# Altium footprint library EwgConnectors.PcbLib: 125 footprints (part 4 of 8)
Each footprint in its own frame and in the unit in brackets; x right, y up, seen from the top. Pads: shape width x height; smd on the part's side, far side on the other; paste and mask are expansions set on the pad; w line width, h text height; cw(c..) or ccw(c..) is an arc to the next point about the centre after c.
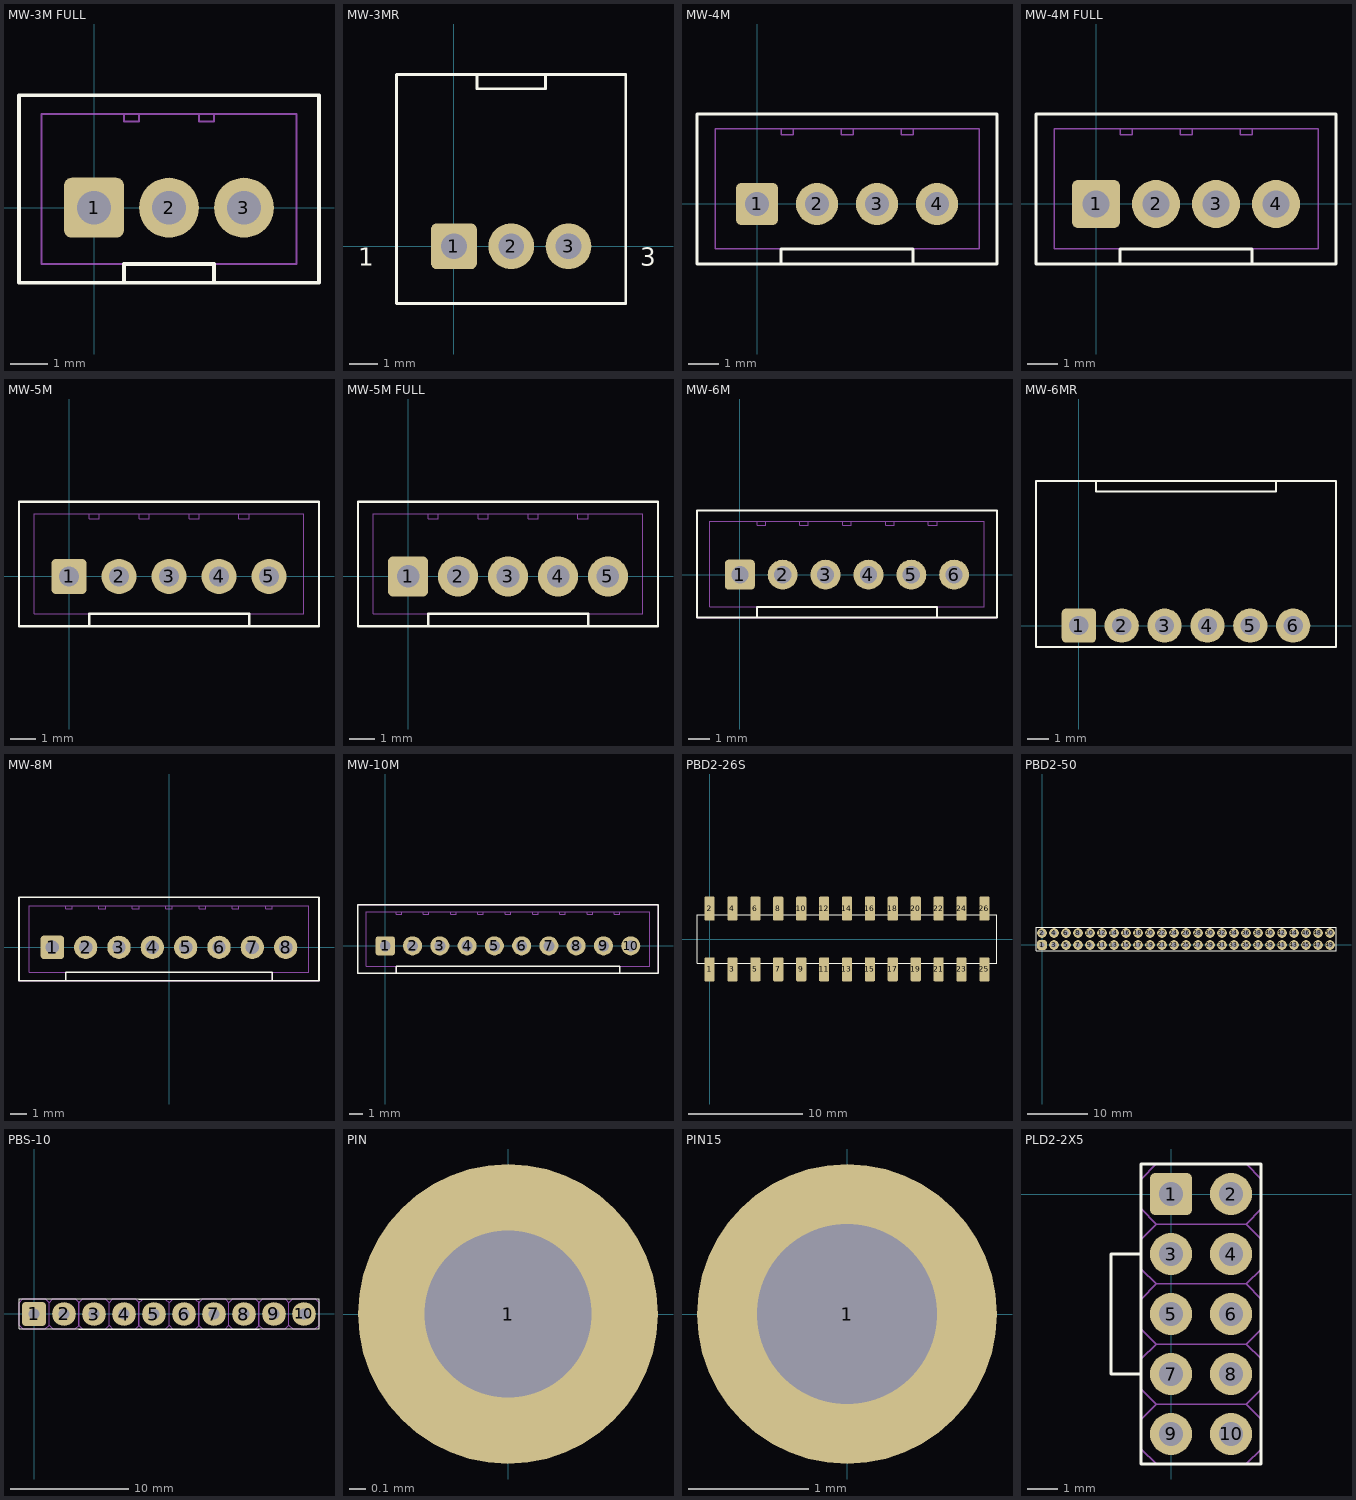
[diagram p3: the footprints below, top view; thin cyan lines are the x and y axes]

## MW-3M FULL [mm]
pads (3):
  rrect25% 1.6x1.6 hole 0.9: 1(0,0)
  round 1.6 hole 0.9: 2(2,0) 3(4,0)
Top Overlay:
  lines w0.1: 0.8,-2 0.8,-1.5 3.2,-1.5 3.2,-2 ; -2,-2 6,-2 6,2 6,3 -2,3 -2,-2
Mechanical 1:
  lines w0.05: 0.8,-2 0.8,-1.5 -1.4,-1.5 -1.4,2.5 5.4,2.5 5.4,-1.5 3.2,-1.5 3.2,-2 ; 0.8,2.5 0.8,2.3 1.2,2.3 1.2,2.5 ; 2.8,2.5 2.8,2.3 3.2,2.3 3.2,2.5 ; -2,-2 -2,3 6,3 6,-2 1.2,-2 -2,-2 ; -0.3,-0.3 0.3,-0.3 0.3,0.3 -0.3,0.3 -0.3,-0.3 ; 1.7,-0.3 1.7,0.3 2.3,0.3 2.3,-0.3 1.7,-0.3 ; 3.7,-0.3 3.7,0.3 4.3,0.3 4.3,-0.3 3.7,-0.3
3D body: height 8.9, standoff 1.5, extent -1.9,-1.75 5.9,2.75
3D body: height 6, standoff -3, extent -2,-2 6,3

## MW-3MR [mm]
pads (3):
  rrect25% 1.6x1.6 hole 0.9: 1(0,0)
  round 1.6 hole 0.9: 2(2,0) 3(4,0)
Top Overlay:
  lines w0.1: 0.8,6 0.8,5.5 3.2,5.5 3.2,6 ; -2,-2 -2,6 6,6 6,2 6,-2 -2,-2
  text "1" at -3.35,-0.675 h0.63
  text "3" at 6.5,-0.675 h0.63
Mechanical 1:
  lines w0.05: -1.4,6 5.4,6 ; 0.8,5.5 0.8,6 ; 3.2,5.5 3.2,6 ; -2,-2 1.2,-2 6,-2 6,6 -2,6 -2,-2 ; -0.3,-0.3 -0.3,0.3 0.3,0.3 0.3,-0.3 -0.3,-0.3 ; 1.7,-0.3 2.3,-0.3 2.3,0.3 1.7,0.3 1.7,-0.3 ; 3.7,-0.3 4.3,-0.3 4.3,0.3 3.7,0.3 3.7,-0.3

## MW-4M [mm]
pads (4):
  rrect25% 1.4x1.4 hole 0.8: 1(0,0)
  round 1.4 hole 0.8: 2(2,0) 3(4,0) 4(6,0)
Top Overlay:
  lines w0.1: 0.8,-2 0.8,-1.5 5.2,-1.5 5.2,-2 ; -2,-2 8,-2 8,2 8,3 -2,3 -2,-2
Mechanical 1:
  lines w0.05: 0.8,-2 0.8,-1.5 -1.4,-1.5 -1.4,2.5 7.4,2.5 7.4,-1.5 5.2,-1.5 5.2,-2 ; 0.8,2.5 0.8,2.3 1.2,2.3 1.2,2.5 ; 2.8,2.5 2.8,2.3 3.2,2.3 3.2,2.5 ; 4.8,2.5 4.8,2.3 5.2,2.3 5.2,2.5 ; -2,-2 1.2,-2 8,-2 8,3 -2,3 -2,-2 ; -0.3,-0.3 0.3,-0.3 0.3,0.3 -0.3,0.3 -0.3,-0.3 ; 1.7,-0.3 1.7,0.3 2.3,0.3 2.3,-0.3 1.7,-0.3 ; 3.7,-0.3 3.7,0.3 4.3,0.3 4.3,-0.3 3.7,-0.3 ; 5.7,-0.3 5.7,0.3 6.3,0.3 6.3,-0.3 5.7,-0.3
3D body: height 6, standoff -3, extent -2,-2 8,3

## MW-4M FULL [mm]
pads (4):
  rrect25% 1.6x1.6 hole 0.9: 1(0,0)
  round 1.6 hole 0.9: 2(2,0) 3(4,0) 4(6,0)
Top Overlay:
  lines w0.1: 0.8,-2 0.8,-1.5 5.2,-1.5 5.2,-2 ; -2,-2 8,-2 8,2 8,3 -2,3 -2,-2
Mechanical 1:
  lines w0.05: 0.8,-2 0.8,-1.5 -1.4,-1.5 -1.4,2.5 7.4,2.5 7.4,-1.5 5.2,-1.5 5.2,-2 ; 0.8,2.5 0.8,2.3 1.2,2.3 1.2,2.5 ; 2.8,2.5 2.8,2.3 3.2,2.3 3.2,2.5 ; 4.8,2.5 4.8,2.3 5.2,2.3 5.2,2.5 ; -2,-2 1.2,-2 8,-2 8,3 -2,3 -2,-2 ; -0.3,-0.3 0.3,-0.3 0.3,0.3 -0.3,0.3 -0.3,-0.3 ; 1.7,-0.3 1.7,0.3 2.3,0.3 2.3,-0.3 1.7,-0.3 ; 3.7,-0.3 3.7,0.3 4.3,0.3 4.3,-0.3 3.7,-0.3 ; 5.7,-0.3 5.7,0.3 6.3,0.3 6.3,-0.3 5.7,-0.3
3D body: height 8.9, standoff 1.5, extent -1.9,-1.75 7.9,2.75
3D body: height 6, standoff -3, extent -2,-2 8,3

## MW-5M [mm]
pads (5):
  rrect25% 1.4x1.4 hole 0.8: 1(0,0)
  round 1.4 hole 0.8: 2(2,0) 3(4,0) 4(6,0) 5(8,0)
Top Overlay:
  lines w0.1: 0.8,-2 0.8,-1.5 7.2,-1.5 7.2,-2 ; -2,-2 -2,3 10,3 10,2 10,-2 -2,-2
Mechanical 1:
  lines w0.05: 0.8,-2 0.8,-1.5 -1.4,-1.5 -1.4,2.5 9.4,2.5 9.4,-1.5 7.2,-1.5 7.2,-2 ; 0.8,2.5 0.8,2.3 1.2,2.3 1.2,2.5 ; 2.8,2.5 2.8,2.3 3.2,2.3 3.2,2.5 ; 4.8,2.5 4.8,2.3 5.2,2.3 5.2,2.5 ; 6.8,2.5 6.8,2.3 7.2,2.3 7.2,2.5 ; -2,-2 1.2,-2 10,-2 10,3 -2,3 -2,-2 ; -0.3,-0.3 -0.3,0.3 0.3,0.3 0.3,-0.3 -0.3,-0.3 ; 1.7,-0.3 2.3,-0.3 2.3,0.3 1.7,0.3 1.7,-0.3 ; 3.7,-0.3 4.3,-0.3 4.3,0.3 3.7,0.3 3.7,-0.3 ; 5.7,-0.3 6.3,-0.3 6.3,0.3 5.7,0.3 5.7,-0.3 ; 7.7,-0.3 8.3,-0.3 8.3,0.3 7.7,0.3 7.7,-0.3
3D body: height 6, standoff -3, extent -2,-2 10,3

## MW-5M FULL [mm]
pads (5):
  rrect25% 1.6x1.6 hole 0.9: 1(0,0)
  round 1.6 hole 0.9: 2(2,0) 3(4,0) 4(6,0) 5(8,0)
Top Overlay:
  lines w0.1: 0.8,-2 0.8,-1.5 7.2,-1.5 7.2,-2 ; -2,-2 -2,3 10,3 10,2 10,-2 -2,-2
Mechanical 1:
  lines w0.05: 0.8,-2 0.8,-1.5 -1.4,-1.5 -1.4,2.5 9.4,2.5 9.4,-1.5 7.2,-1.5 7.2,-2 ; 0.8,2.5 0.8,2.3 1.2,2.3 1.2,2.5 ; 2.8,2.5 2.8,2.3 3.2,2.3 3.2,2.5 ; 4.8,2.5 4.8,2.3 5.2,2.3 5.2,2.5 ; 6.8,2.5 6.8,2.3 7.2,2.3 7.2,2.5 ; -2,-2 1.2,-2 10,-2 10,3 -2,3 -2,-2 ; -0.3,-0.3 -0.3,0.3 0.3,0.3 0.3,-0.3 -0.3,-0.3 ; 1.7,-0.3 2.3,-0.3 2.3,0.3 1.7,0.3 1.7,-0.3 ; 3.7,-0.3 4.3,-0.3 4.3,0.3 3.7,0.3 3.7,-0.3 ; 5.7,-0.3 6.3,-0.3 6.3,0.3 5.7,0.3 5.7,-0.3 ; 7.7,-0.3 8.3,-0.3 8.3,0.3 7.7,0.3 7.7,-0.3
3D body: height 8.9, standoff 1.5, extent -1.9,-1.75 9.9,2.75
3D body: height 6, standoff -3, extent -2,-2 10,3

## MW-6M [mm]
pads (6):
  rrect25% 1.4x1.4 hole 0.8: 1(0,0)
  round 1.4 hole 0.8: 2(2,0) 3(4,0) 4(6,0) 5(8,0) 6(10,0)
Top Overlay:
  lines w0.1: 0.8,-2 0.8,-1.5 9.2,-1.5 9.2,-2 ; -2,-2 12,-2 12,2 12,3 -2,3 -2,-2
Mechanical 1:
  lines w0.05: 0.8,-2 0.8,-1.5 -1.4,-1.5 -1.4,2.5 11.4,2.5 11.4,-1.5 9.2,-1.5 9.2,-2 ; 0.8,2.5 0.8,2.3 1.2,2.3 1.2,2.5 ; 2.8,2.5 2.8,2.3 3.2,2.3 3.2,2.5 ; 4.8,2.5 4.8,2.3 5.2,2.3 5.2,2.5 ; 6.8,2.5 6.8,2.3 7.2,2.3 7.2,2.5 ; 8.8,2.5 8.8,2.3 9.2,2.3 9.2,2.5 ; -2,-2 1.2,-2 12,-2 12,3 -2,3 -2,-2 ; -0.3,-0.3 0.3,-0.3 0.3,0.3 -0.3,0.3 -0.3,-0.3 ; 1.7,-0.3 1.7,0.3 2.3,0.3 2.3,-0.3 1.7,-0.3 ; 3.7,-0.3 3.7,0.3 4.3,0.3 4.3,-0.3 3.7,-0.3 ; 5.7,-0.3 5.7,0.3 6.3,0.3 6.3,-0.3 5.7,-0.3 ; 7.7,-0.3 7.7,0.3 8.3,0.3 8.3,-0.3 7.7,-0.3 ; 9.7,-0.3 9.7,0.3 10.3,0.3 10.3,-0.3 9.7,-0.3
3D body: height 6, standoff -3.2, extent -2,-1.75 12,2.75

## MW-6MR [mm]
pads (6):
  rrect25% 1.6x1.6 hole 0.9: 1(0,0)
  round 1.6 hole 0.9: 2(2,0) 3(4,0) 4(6,0) 5(8,0) 6(10,0)
Top Overlay:
  lines w0.1: 0.8,6.75 0.8,6.25 9.2,6.25 9.2,6.75 9.25,6.75 ; -2,-1 -2,6.75 12,6.75 12,2 12,-1 -2,-1
Mechanical 1:
  lines w0.05: 0.8,6.25 0.8,6.75 ; 9.2,6.25 9.2,6.75 ; -2,-1 2.2,-1 12,-1 12,6.75 -2,6.75 -2,-1 ; -0.3,-0.3 -0.3,0.3 0.3,0.3 0.3,-0.3 -0.3,-0.3 ; 1.7,-0.3 2.3,-0.3 2.3,0.3 1.7,0.3 1.7,-0.3 ; 3.7,-0.3 4.3,-0.3 4.3,0.3 3.7,0.3 3.7,-0.3 ; 5.7,-0.3 6.3,-0.3 6.3,0.3 5.7,0.3 5.7,-0.3 ; 7.7,-0.3 8.3,-0.3 8.3,0.3 7.7,0.3 7.7,-0.3 ; 9.7,-0.3 10.3,-0.3 10.3,0.3 9.7,0.3 9.7,-0.3
3D body: height 4.85, standoff -1.95, extent -1.95,-0.85 11.95,6.75

## MW-8M [mm]
pads (8):
  rrect25% 1.4x1.4 hole 0.8: 1(-7,0)
  round 1.4 hole 0.8: 2(-5,0) 3(-3,0) 4(-1,0) 5(1,0) 6(3,0) 7(5,0) 8(7,0)
Top Overlay:
  lines w0.1: -6.2,-2 -6.2,-1.5 6.2,-1.5 6.2,-2 ; -9,-2 9,-2 9,2 9,3 -9,3 -9,-2
Mechanical 1:
  lines w0.05: -6.2,-2 -6.2,-1.5 -8.4,-1.5 -8.4,2.5 8.4,2.5 8.4,-1.5 6.2,-1.5 6.2,-2 ; -6.2,2.5 -6.2,2.3 -5.8,2.3 -5.8,2.5 ; -4.2,2.5 -4.2,2.3 -3.8,2.3 -3.8,2.5 ; -2.2,2.5 -2.2,2.3 -1.8,2.3 -1.8,2.5 ; -0.2,2.5 -0.2,2.3 0.2,2.3 0.2,2.5 ; 1.8,2.5 1.8,2.3 2.2,2.3 2.2,2.5 ; 3.8,2.5 3.8,2.3 4.2,2.3 4.2,2.5 ; 5.8,2.5 5.8,2.3 6.2,2.3 6.2,2.5 ; -9,-2 -9,3 9,3 9,-2 -5.8,-2 -9,-2 ; -7.3,-0.3 -6.7,-0.3 -6.7,0.3 -7.3,0.3 -7.3,-0.3 ; -5.3,-0.3 -5.3,0.3 -4.7,0.3 -4.7,-0.3 -5.3,-0.3 ; -3.3,-0.3 -3.3,0.3 -2.7,0.3 -2.7,-0.3 -3.3,-0.3 ; -1.3,-0.3 -1.3,0.3 -0.7,0.3 -0.7,-0.3 -1.3,-0.3 ; 0.7,-0.3 0.7,0.3 1.3,0.3 1.3,-0.3 0.7,-0.3 ; 2.7,-0.3 3.3,-0.3 3.3,0.3 2.7,0.3 2.7,-0.3 ; 4.7,-0.3 4.7,0.3 5.3,0.3 5.3,-0.3 4.7,-0.3 ; 6.7,-0.3 6.7,0.3 7.3,0.3 7.3,-0.3 6.7,-0.3
3D body: height 6, standoff -3, extent -8.95,-1.75 8.95,2.75

## MW-10M [mm]
pads (10):
  rrect25% 1.4x1.4 hole 0.8: 1(0,0)
  round 1.4 hole 0.8: 2(2,0) 3(4,0) 4(6,0) 5(8,0) 6(10,0) 7(12,0) 8(14,0) 9(16,0) 10(18,0)
Top Overlay:
  lines w0.1: 0.8,-2 0.8,-1.5 17.2,-1.5 17.2,-2 ; -2,-2 20,-2 20,2 20,3 -2,3 -2,-2
Mechanical 1:
  lines w0.05: 0.8,-2 0.8,-1.5 -1.4,-1.5 -1.4,2.5 19.4,2.5 19.4,-1.5 17.2,-1.5 17.2,-2 ; 0.8,2.5 0.8,2.3 1.2,2.3 1.2,2.5 ; 2.8,2.5 2.8,2.3 3.2,2.3 3.2,2.5 ; 4.8,2.5 4.8,2.3 5.2,2.3 5.2,2.5 ; 6.8,2.5 6.8,2.3 7.2,2.3 7.2,2.5 ; 8.8,2.5 8.8,2.3 9.2,2.3 9.2,2.5 ; 10.8,2.5 10.8,2.3 11.2,2.3 11.2,2.5 ; 12.8,2.5 12.8,2.3 13.2,2.3 13.2,2.5 ; 14.8,2.5 14.8,2.3 15.2,2.3 15.2,2.5 ; 16.8,2.5 16.8,2.3 17.2,2.3 17.2,2.5 ; -2,-2 -2,3 20,3 20,-2 1.2,-2 -2,-2 ; -0.3,-0.3 0.3,-0.3 0.3,0.3 -0.3,0.3 -0.3,-0.3 ; 1.7,-0.3 1.7,0.3 2.3,0.3 2.3,-0.3 1.7,-0.3 ; 3.7,-0.3 3.7,0.3 4.3,0.3 4.3,-0.3 3.7,-0.3 ; 5.7,-0.3 5.7,0.3 6.3,0.3 6.3,-0.3 5.7,-0.3 ; 7.7,-0.3 7.7,0.3 8.3,0.3 8.3,-0.3 7.7,-0.3 ; 9.7,-0.3 10.3,-0.3 10.3,0.3 9.7,0.3 9.7,-0.3 ; 11.7,-0.3 11.7,0.3 12.3,0.3 12.3,-0.3 11.7,-0.3 ; 13.7,-0.3 13.7,0.3 14.3,0.3 14.3,-0.3 13.7,-0.3 ; 15.7,-0.3 15.7,0.3 16.3,0.3 16.3,-0.3 15.7,-0.3 ; 17.7,-0.3 17.7,0.3 18.3,0.3 18.3,-0.3 17.7,-0.3
3D body: height 6, standoff -3, extent -1.95,-1.75 19.95,2.75

## PBD2-26S [mm] "PLD2-50"
pads (26):
  rrect25% 0.89x2.1 smd: 1(0,-2.65) 2(0,2.65) 3(2,-2.65) 4(2,2.65) 5(4,-2.65) 6(4,2.65) 7(6,-2.65) 8(6,2.65) 9(8,-2.65) 10(8,2.65) 11(10,-2.65) 12(10,2.65) 13(12,-2.65) 14(12,2.65) 15(14,-2.65) 16(14,2.65) 17(16,-2.65) 18(16,2.65) 19(18,-2.65) 20(18,2.65) 21(20,-2.65) 22(20,2.65) 23(22,-2.65) 24(22,2.65) 25(24,-2.65) 26(24,2.65)
Top Overlay:
  lines w0.1: -1.1,-2.1 25.1,-2.1 25.1,2.1 -1.1,2.1 -1.1,-2.1
3D body: height 4.2, standoff 0, extent -1,-2.9 25,3.1

## PBD2-50 [mm] "PLD2-50"
pads (50):
  rrect50% 1.6x1.6 hole 0.8: 1(0,0)
  round 1.6 hole 0.8: 2(0,2) 3(2,0) 4(2,2) 5(4,0) 6(4,2) 7(6,0) 8(6,2) 9(8,0) 10(8,2) 11(10,0) 12(10,2) 13(12,0) 14(12,2) 15(14,0) 16(14,2) 17(16,0) 18(16,2) 19(18,0) 20(18,2) 21(20,0) 22(20,2) 23(22,0) 24(22,2) 25(24,0) 26(24,2) 27(26,0) 28(26,2) 29(28,0) 30(28,2) 31(30,0) 32(30,2) 33(32,0) 34(32,2) 35(34,0) 36(34,2) 37(36,0) 38(36,2) 39(38,0) 40(38,2) 41(40,0) 42(40,2) 43(42,0) 44(42,2) 45(44,0) 46(44,2) 47(46,0) 48(46,2) 49(48,0) 50(48,2)
Top Overlay:
  lines w0.1: -1,-1 49,-1 49,3 -1,3 -1,-1
3D body: height 4.5, standoff -2.7, extent -1,-1 49,3

## PBS-10 [mm]
pads (10):
  rrect25% 2x2 hole 0.965: 1(0,0)
  round 2 hole 0.965: 2(2.54,0) 3(5.08,0) 4(7.62,0) 5(10.16,0) 6(12.7,0) 7(15.24,0) 8(17.78,0) 9(20.32,0) 10(22.86,0)
Top Overlay:
  lines w0.1: 3.81,-1.27 8.89,-1.27 11.43,-1.27 ; 3.81,1.27 8.89,1.27 11.43,1.27 ; 19.05,-1.27 13.97,-1.27 11.43,-1.27 ; 19.05,1.27 13.97,1.27 11.43,1.27 ; 11.43,-1.27 -1.27,-1.27 -1.27,1.27 11.43,1.27 ; 11.43,-1.27 24.13,-1.27 24.13,1.27 11.43,1.27
Mechanical 1:
  lines w0.05: 1.27,-0.953 0.953,-1.27 -0.953,-1.27 -1.27,-0.953 -1.27,0.953 -0.953,1.27 0.953,1.27 1.27,0.953 ; 1.27,-0.953 1.587,-1.27 3.492,-1.27 3.81,-0.953 ; 1.27,-0.953 1.27,0.953 ; 1.27,0.953 1.587,1.27 3.492,1.27 3.81,0.953 ; 3.81,-0.953 3.81,0.952 ; 3.81,-0.953 4.127,-1.27 6.032,-1.27 6.35,-0.953 ; 3.81,-0.953 3.81,0.953 ; 3.81,0.952 4.127,1.27 6.032,1.27 6.35,0.952 ; 6.35,-0.953 6.35,0.952 ; 6.35,-0.953 6.667,-1.27 8.572,-1.27 8.89,-0.953 ; 6.35,0.952 6.667,1.27 8.572,1.27 8.89,0.952 ; 8.89,-0.953 8.89,0.952 ; 8.89,-0.953 9.207,-1.27 11.112,-1.27 11.43,-0.953 ; 8.89,-0.953 8.89,0.952 ; 8.89,0.952 9.207,1.27 11.112,1.27 11.43,0.952 ; 11.43,-0.953 11.43,0.952 ; 11.43,-0.953 11.747,-1.27 13.652,-1.27 13.97,-0.953 ; 11.43,-0.953 11.43,0.952 ; 11.43,0.952 11.747,1.27 13.652,1.27 13.97,0.952 ; 13.97,-0.953 14.287,-1.27 16.192,-1.27 16.51,-0.953 ; 13.97,-0.953 13.97,0.952 ; 13.97,-0.953 13.97,0.952 ; 13.97,0.952 14.287,1.27 16.192,1.27 16.51,0.952 ; 16.51,-0.953 16.827,-1.27 18.732,-1.27 19.05,-0.953 ; 16.51,-0.953 16.51,0.952 ; 16.51,0.952 16.827,1.27 18.732,1.27 19.05,0.952 ; 19.05,-0.953 19.05,0.953 ; 19.05,-0.953 19.367,-1.27 21.272,-1.27 21.59,-0.953 ; 19.05,-0.953 19.05,0.952 ; 19.05,0.953 19.367,1.27 21.272,1.27 21.59,0.953 ; 21.59,-0.953 21.59,0.953 ; 21.59,-0.953 21.907,-1.27 23.812,-1.27 24.13,-0.953 24.13,0.953 23.812,1.27 21.907,1.27 21.59,0.953 ; -0.318,-0.318 -0.318,0.318 0.318,0.318 0.318,-0.318 -0.318,-0.318 ; 2.222,-0.318 2.857,-0.318 2.857,0.318 2.222,0.318 2.222,-0.318 ; 4.762,-0.318 5.397,-0.318 5.397,0.317 4.762,0.317 4.762,-0.318 ; 7.302,-0.318 7.302,0.317 7.937,0.317 7.937,-0.318 7.302,-0.318 ; 9.842,-0.318 10.477,-0.318 10.477,0.317 9.842,0.317 9.842,-0.318 ; 12.382,-0.318 12.382,0.317 13.017,0.317 13.017,-0.318 12.382,-0.318 ; 14.922,-0.318 15.557,-0.318 15.557,0.317 14.922,0.317 14.922,-0.318 ; 17.462,-0.318 17.462,0.317 18.097,0.317 18.097,-0.318 17.462,-0.318 ; 20.002,-0.318 20.002,0.318 20.637,0.318 20.637,-0.318 20.002,-0.318 ; 22.542,-0.318 23.177,-0.318 23.177,0.318 22.542,0.318 22.542,-0.318
3D body: height 8.4, standoff -3.2, extent -1.27,-1.27 24.13,1.27

## PIN [mm]
pads (1):
  round 1.8 hole 1: 1(0,0)

## PIN15 [mm]
pads (1):
  round 2.5 hole 1.5: 1(0,0)

## PLD2-2X5 [mm]
pads (10):
  rrect25% 1.4x1.4 hole 0.8: 1(0,0)
  round 1.4 hole 0.8: 2(2,0) 3(0,-2) 4(2,-2) 5(0,-4) 6(2,-4) 7(0,-6) 8(2,-6) 9(0,-8) 10(2,-8)
Top Overlay:
  lines w0.1: -1,-6 -2,-6 -2,-2 -1,-2 ; -1,-9 3,-9 3,1 -1,1 -1,-9
Mechanical 1:
  lines w0.05: -0.5,-7 2.5,-7 ; -0.5,-7 2.5,-7 ; -0.5,-7 -1,-7.5 -1,-8.5 -0.5,-9 2.5,-9 3,-8.5 3,-7.5 2.5,-7 ; -0.5,-7 -1,-6.5 -1,-5.5 -0.5,-5 ; -0.5,-5 2.5,-5 ; -0.5,-5 2.5,-5 ; -0.5,-5 -1,-4.5 -1,-3.5 -0.5,-3 ; -0.5,-3 2.5,-3 ; -0.5,-3 2.5,-3 ; -0.5,-3 -1,-2.5 -1,-1.5 -0.5,-1 ; -0.5,-1 2.5,-1 ; -0.5,-1 2.5,-1 ; -0.5,-1 -1,-0.5 -1,0.5 -0.5,1 2.5,1 3,0.5 3,-0.5 2.5,-1 ; 2.5,-7 3,-6.5 3,-5.5 2.5,-5 ; 2.5,-5 3,-4.5 3,-3.5 2.5,-3 ; 2.5,-3 3,-2.5 3,-1.5 2.5,-1 ; -0.25,-8.25 0.25,-8.25 0.25,-7.75 -0.25,-7.75 -0.25,-8.25 ; -0.25,-6.25 0.25,-6.25 0.25,-5.75 -0.25,-5.75 -0.25,-6.25 ; -0.25,-4.25 0.25,-4.25 0.25,-3.75 -0.25,-3.75 -0.25,-4.25 ; -0.25,-2.25 0.25,-2.25 0.25,-1.75 -0.25,-1.75 -0.25,-2.25 ; -0.25,-0.25 0.25,-0.25 0.25,0.25 -0.25,0.25 -0.25,-0.25 ; 1.75,-8.25 2.25,-8.25 2.25,-7.75 1.75,-7.75 1.75,-8.25 ; 1.75,-6.25 2.25,-6.25 2.25,-5.75 1.75,-5.75 1.75,-6.25 ; 1.75,-4.25 2.25,-4.25 2.25,-3.75 1.75,-3.75 1.75,-4.25 ; 1.75,-2.25 2.25,-2.25 2.25,-1.75 1.75,-1.75 1.75,-2.25 ; 1.75,-0.25 2.25,-0.25 2.25,0.25 1.75,0.25 1.75,-0.25
3D body: height 5.5, standoff -2.5, extent -1.3,-9 3.3,1